# Altium footprint library Other.PcbLib: 104 footprints (part 2 of 7)
Each footprint in its own frame and in the unit in brackets; x right, y up, seen from the top. Pads: shape width x height; smd on the part's side, far side on the other; paste and mask are expansions set on the pad; w line width, h text height; cw(c..) or ccw(c..) is an arc to the next point about the centre after c.
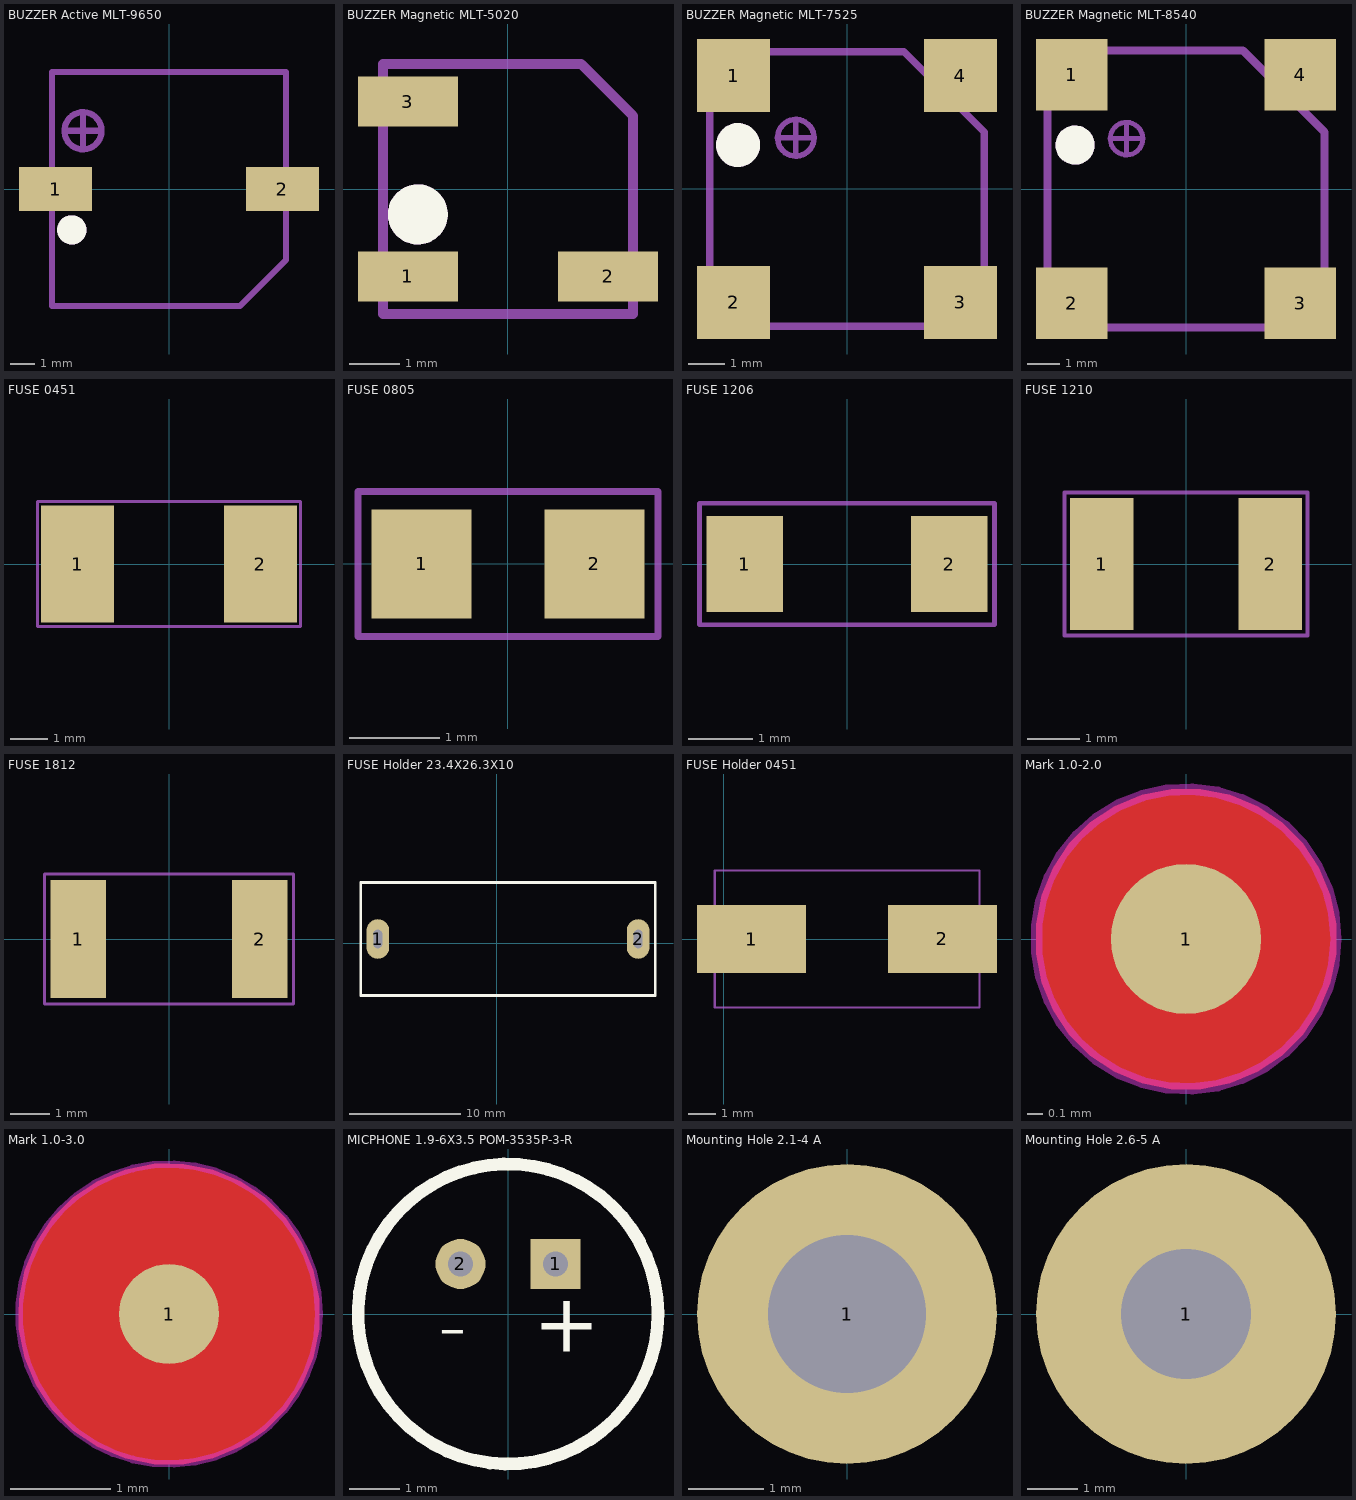
[diagram p1: the footprints below, top view; thin cyan lines are the x and y axes]

## BUZZER Active MLT-9650 [mm] "贴片无源蜂鸣器"
height 4
pads (2):
  rect 3x1.8 smd: 1(-4.65,0) 2(4.65,0)
Top Overlay:
  circle w0.6: c-3.988,-1.676 r0.3
Mechanical 15:
  circle w0.6: c-3.988,-1.676 r0.3
  circle w0.254: c-3.526,2.388 r0.762
  lines w0.254: -4.288,2.388 -2.764,2.388 ; -3.526,1.626 -3.526,3.15 ; -4.8,-4.8 2.9,-4.8 4.8,-2.9 4.8,4.8 -4.8,4.8 -4.8,-4.8
3D body "MLT-9650Y-05-1.step": height 5, standoff 0, extent -5,-4.8 5,4.8

## BUZZER Magnetic MLT-5020 [mm] "无源蜂鸣器"
pads (3):
  rect 2x1 smd: 1(-2,-1.75) 2(2,-1.75) 3(-2,1.75)
Top Overlay:
  circle w0.6: c-1.803,-0.508 r0.3
Mechanical 15:
  circle w0.6: c-1.803,-0.508 r0.3
  lines w0.203: -2.5,-2.5 2.5,-2.5 2.5,1.462 1.462,2.5 -2.5,2.5 -2.5,-2.5
  text "+" at -1.041,-1.295 h1.52
  text "-" at 2.184,-1.295 h1.52
3D body "KLJ-5025.step": height 2.54, standoff 0.03, extent -2.5,-2.5 2.5,2.5

## BUZZER Magnetic MLT-7525 [mm] "无源蜂鸣器"
pads (4):
  rect 2x2 smd: 1(-3.1,3.1) 2(-3.1,-3.1) 3(3.1,-3.1) 4(3.1,3.1)
Top Overlay:
  circle w0.6: c-2.98,1.202 r0.3
Mechanical 15:
  circle w0.152: c-1.4,1.4 r0.5
  circle w0.6: c-2.98,1.202 r0.3
  lines w0.152: -1.9,1.4 -0.9,1.4 ; -1.4,0.9 -1.4,1.9
  lines w0.203: -3.75,-3.75 3.75,-3.75 3.75,1.559 1.559,3.75 -3.75,3.75 -3.75,-3.75
3D body "YX7525P.STEP": height 2.53, standoff 0.02, extent -3.75,-3.75 3.75,3.75

## BUZZER Magnetic MLT-8540 [mm] "贴片无源蜂鸣器"
height 4
pads (4):
  rect 2.2x2.2 smd: 1(-3.5,3.5) 2(-3.5,-3.5) 3(3.5,-3.5) 4(3.5,3.5)
Top Overlay:
  circle w0.6: c-3.404,1.346 r0.3
Mechanical 15:
  circle w0.152: c-1.824,1.544 r0.5
  circle w0.6: c-3.404,1.346 r0.3
  lines w0.152: -2.324,1.544 -1.324,1.544 ; -1.824,1.044 -1.824,2.044
  lines w0.254: -4.25,-4.25 -4.25,4.25 1.744,4.25 4.25,1.744 4.25,-4.25 -4.25,-4.25
3D body "cmt-8540s-smt.stp": height 4.02, standoff 0.02, extent -4.245,-4.25 4.255,4.25

## FUSE 0451 [mm] "贴片保险电阻1808封装"
height 0.55
pads (2):
  rect 1.96x3.15 smd: 1(-2.45,0) 2(2.45,0)
Mechanical 15:
  lines w0.076: -3.531,-1.676 -3.531,1.676 3.531,1.676 3.531,-1.676 -3.531,-1.676
3D body "Fuse 0451 Littlefuse 0451 SMD.STEP": height 2.69, standoff 0, extent -3,-1.345 3,1.345

## FUSE 0805 [mm] "贴片保险电阻0805封装"
height 0.55
pads (2):
  rect 1.1x1.2 smd paste-2: 1(-0.95,0) 2(0.95,0)
Top Paste:
  region: 1.397,0.52 0.813,0.52 0.813,-0.533 1.397,-0.533
  rectangle: -1.397,-0.52 -0.813,0.533
  lines w0.076: -1.206,-0.457 -0.52,-0.457 ; -1.206,-0.381 -0.52,-0.381 ; -1.206,-0.305 -0.52,-0.305 ; -1.206,-0.229 -0.52,-0.229 ; -1.206,0.457 -0.52,0.457 ; -1.205,0.381 -0.52,0.381 ; -1.204,0.305 -0.52,0.305 ; -1.203,0.229 -0.52,0.229 ; -0.876,-0.186 -0.52,-0.186 ; -0.876,0.186 -0.52,0.186 ; 0.52,-0.457 1.206,-0.457 ; 0.52,-0.381 1.205,-0.381 ; 0.52,-0.305 1.204,-0.305 ; 0.52,-0.229 1.203,-0.229 ; 0.52,0.229 1.206,0.229 ; 0.52,0.305 1.206,0.305 ; 0.52,0.381 1.206,0.381 ; 0.52,0.457 1.206,0.457 ; 0.876,-0.186 0.52,-0.186 ; 0.876,0.186 0.52,0.186 ; -0.52,-0.186 -0.66,-0.186 cw(c-0.66,0) -0.66,0.186 -0.52,0.186 ; -0.52,-0.186 -0.52,-0.52 -1.422,-0.52 -1.422,0.52 -0.52,0.52 -0.52,0.186 ; 0.52,-0.186 0.52,-0.52 1.422,-0.52 1.422,0.52 0.52,0.52 0.52,0.186 ; 0.52,-0.186 0.66,-0.186 ccw(c0.66,0) 0.66,0.186 0.52,0.186
Mechanical 15:
  lines w0.076: -1.651,-0.8 1.651,-0.8 1.651,0.8 -1.651,0.8 -1.651,-0.8
3D body "fuse0805-2.stp": height 0.66, standoff 0, extent -1.075,-0.675 1.075,0.675

## FUSE 1206 [mm] "贴片保险电阻1206封装"
height 0.55
pads (2):
  rect 1.2x1.5 smd paste-3: 1(-1.6,0) 2(1.6,0)
Top Paste:
  lines w0.1: -2.108,-0.61 -1.095,-0.61 ; -2.108,-0.533 -1.095,-0.533 ; -2.108,-0.457 -1.095,-0.457 ; -2.108,-0.381 -1.095,-0.381 ; -2.108,-0.305 -1.095,-0.305 ; -2.108,-0.229 -1.448,-0.229 ; -2.108,-0.152 -1.524,-0.152 ; -2.108,-0.076 -1.549,-0.076 ; -2.108,0 -1.549,0 ; -2.108,0.076 -1.549,0.076 ; -2.108,0.152 -1.549,0.152 ; -2.108,0.229 -1.448,0.229 ; -2.108,0.305 -1.095,0.305 ; -2.108,0.356 -1.095,0.356 ; -2.108,0.432 -1.095,0.432 ; -2.108,0.508 -1.095,0.508 ; -2.108,0.584 -1.095,0.584 ; 1.095,-0.584 2.108,-0.584 ; 1.095,-0.508 2.108,-0.508 ; 1.095,-0.432 2.108,-0.432 ; 1.095,-0.356 2.108,-0.356 ; 1.095,-0.305 2.108,-0.305 ; 1.095,0.305 2.108,0.305 ; 1.095,0.381 2.108,0.381 ; 1.095,0.457 2.108,0.457 ; 1.095,0.533 2.108,0.533 ; 1.095,0.61 2.108,0.61 ; 1.448,-0.229 2.108,-0.229 ; 1.448,0.229 2.108,0.229 ; 1.524,0.152 2.108,0.152 ; 1.549,-0.152 2.108,-0.152 ; 1.549,-0.076 2.108,-0.076 ; 1.549,0 2.108,0 ; 1.549,0.076 2.108,0.076 ; -2.108,-0.66 -2.108,0.66 -1.095,0.66 -1.095,0.3 -1.245,0.3 ccw(c-1.245,0) -1.245,-0.3 -1.095,-0.3 -1.095,-0.66 -2.108,-0.66 ; 1.095,-0.66 2.108,-0.66 2.108,0.66 1.095,0.66 1.095,0.3 1.245,0.3 cw(c1.245,0) 1.245,-0.3 1.095,-0.3 1.095,-0.66
Mechanical 15:
  lines w0.076: -2.311,-0.952 -2.311,0.953 2.311,0.953 2.311,-0.952 -2.311,-0.952
3D body "Fuse 1206.STEP": height 0.56, standoff 0, extent -1.601,-0.826 1.601,0.826

## FUSE 1210 [mm] "贴片保险电阻1206封装"
height 0.55
pads (2):
  rect 1.2x2.5 smd: 1(-1.6,0) 2(1.6,0)
Mechanical 15:
  lines w0.076: -2.311,-1.359 2.311,-1.359 2.311,1.359 -2.311,1.359 -2.311,-1.359
3D body "Fuse 1210.STEP": height 0.67, standoff 0, extent -1.607,-1.287 1.608,1.288

## FUSE 1812 [mm] "贴片保险电阻1812封装"
height 0.55
pads (2):
  rect 1.4x3 smd: 1(-2.3,0) 2(2.3,0)
Mechanical 15:
  lines w0.076: -3.15,-1.651 3.15,-1.651 3.15,1.651 -3.15,1.651 -3.15,-1.651
3D body "Fuse 1812.STEP": height 1.03, standoff 0, extent -2.365,-1.74 2.37,1.74

## FUSE Holder 23.4X26.3X10 [mil] "保险丝"
pads (2):
  oval 80x140 hole 30 slot 65 at 90 deg paste+0: 1(-420,15)
  oval 80x140 hole 30 slot 65 at 90 deg: 2(500,15)
Top Overlay:
  lines w10: -480,-185 -480,215 560,215 560,-185 -480,-185
3D body "Fuse_Holder.STEP": height 529.25, standoff -212.72, extent -416.97,-162.16 494.84,192.17

## FUSE Holder 0451 [mm] "贴片保险电阻1808封装"
height 0.55
pads (2):
  rect 4x2.5 smd: 1(1.02,0) 2(8.02,0)
Mechanical 15:
  lines w0.076: -0.33,-2.515 9.373,-2.515 9.373,2.515 -0.33,2.515 -0.33,-2.515
3D body "Fuse 0451 Holder Littlefuse 0154 Holder and Fuse.STEP": height 3.74, standoff 0.04, extent -0.33,-2.5 9.37,2.5

## Mark 1.0-2.0 [mm]
pads (1):
  round 1 smd mask+0.5: 1(0,0)
Top Layer:
  pour cut-out: 0,-1 -0.098,-1 -0.292,-0.962 -0.474,-0.886 -0.637,-0.777 -0.777,-0.637 -0.886,-0.474 -0.962,-0.292 -1,-0.098 -1,0 -1,0.098 -0.962,0.292 -0.886,0.474 -0.777,0.637 -0.637,0.777 -0.474,0.886 -0.292,0.962 -0.098,1 0,1 0.098,1 0.292,0.962 0.474,0.886 0.637,0.777 0.777,0.637 0.886,0.474 0.962,0.292 1,0.098 1,0 1,-0.098 0.962,-0.292 0.886,-0.474 0.777,-0.637 0.637,-0.777 0.474,-0.886 0.292,-0.962 0.098,-1
Keep-Out Layer:
  circle w0.076: c0,0 r1

## Mark 1.0-3.0 [mm]
pads (1):
  round 1 smd mask+1: 1(0,0)
Top Layer:
  pour cut-out: 0,-1.5 -0.148,-1.5 -0.438,-1.442 -0.711,-1.329 -0.956,-1.165 -1.165,-0.956 -1.329,-0.711 -1.442,-0.438 -1.5,-0.148 -1.5,0 -1.5,0.148 -1.442,0.438 -1.329,0.711 -1.165,0.956 -0.956,1.165 -0.711,1.329 -0.438,1.442 -0.148,1.5 0,1.5 0.148,1.5 0.438,1.442 0.711,1.329 0.956,1.165 1.165,0.956 1.329,0.711 1.442,0.438 1.5,0.148 1.5,0 1.5,-0.148 1.442,-0.438 1.329,-0.711 1.165,-0.956 0.956,-1.165 0.711,-1.329 0.438,-1.442 0.148,-1.5
Keep-Out Layer:
  circle w0.076: c0,0 r1.5

## MICPHONE 1.9-6X3.5 POM-3535P-3-R [mm] "小号麦克风"
height 5
pads (2):
  rect 1x1 hole 0.5: 1(0.95,1)
  round 1 hole 0.5: 2(-0.95,1)
Top Overlay:
  lines w0.254: 3,0.013 ccw(c0,0) 3,0.013
  text "-" at -1.397,-1.143 h2
  text "+" at 0.503,-1.143 h2
3D body: height 0.2, standoff -2.8, extent 0.725,0.775 1.175,1.225
3D body: height 0.2, standoff -2.8, extent -1.175,0.776 -0.725,1.225
3D body: height 3.7, standoff 3.5, extent -2.8,-2.799 2.8,2.799
3D body: height 3.5, standoff 0, extent -3,-2.999 3,2.999

## Mounting Hole 2.1-4 A [mm] "2.5mm固定孔"
pads (1):
  round 4 hole 2.1: 1(0,0)
3D body "TR Fastenings Ltd-M2_5X6MM.step": height 5.5, standoff -3, extent -2.25,-2.25 2.25,2.25

## Mounting Hole 2.6-5 A [mm] "2.5mm固定孔"
pads (1):
  round 6 hole 2.6: 1(0,0)
3D body "TR Fastenings Ltd-M2_5X6MM.step": height 5.5, standoff -3, extent -2.25,-2.25 2.25,2.25